# Altium footprint library PcbLib1.PcbLib: 31 footprints (part 2 of 2)
Each footprint in its own frame and in the unit in brackets; x right, y up, seen from the top. Pads: shape width x height; smd on the part's side, far side on the other; paste and mask are expansions set on the pad; w line width, h text height; cw(c..) or ccw(c..) is an arc to the next point about the centre after c.
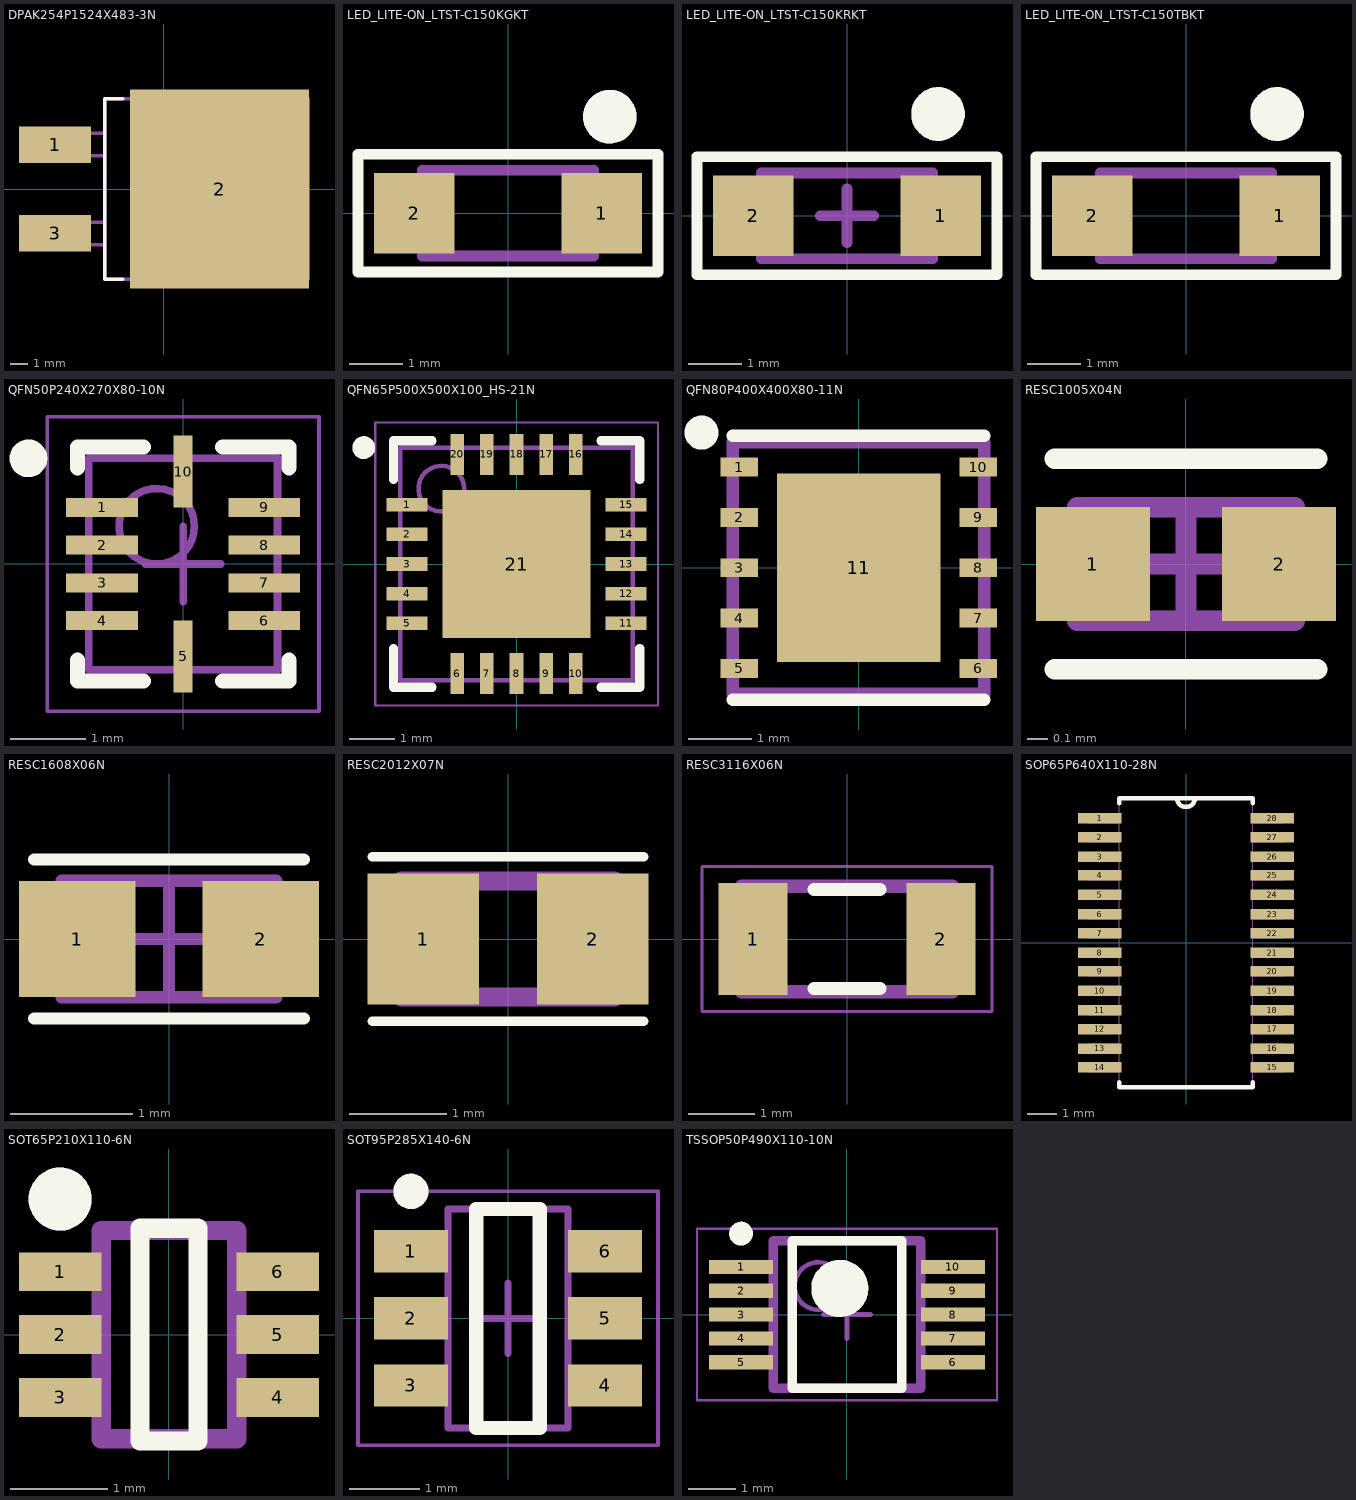
[diagram p1: the footprints below, top view; thin cyan lines are the x and y axes]

## DPAK254P1524X483-3N [mm] "D2-PAK, 3-Pads, Body 7.93x8.57mm (max), IPC Medium Density"
height 4.83
pads (3):
  rect 4.15x2.08 smd: 1(-6.25,2.54) 3(-6.25,-2.54)
  rect 10.3x11.43 smd: 2(3.2,0)
Top Overlay:
  lines w0.2: -2.35,-5.2 -3.4,-5.2 -3.4,5.2 -2.35,5.2
Mechanical 17:
  lines w0.2: -3.4,-3.2 -6.8,-3.2 -6.8,-1.9 -3.4,-1.9 ; -3.4,1.9 -6.8,1.9 -6.8,3.2 -3.4,3.2 ; -3.4,-5.2 -3.4,5.2 8.3,5.2 8.3,-5.2 -3.4,-5.2
  text ".designator" at -7.7,-0.3 h1.5
3D body "DPAK254P1524X483-3N.step": height 4.83, standoff 0, extent -6.795,-5.2 8.45,5.2

## LED_LITE-ON_LTST-C150KGKT [mm] "Lite-On Blue 1206 Chip LED"
height 1.1
pads (2):
  rect 1.5x1.5 smd: 1(1.75,0) 2(-1.75,0)
Top Overlay:
  circle w0.6: c1.9,1.8 r0.2
  lines w0.2: -2.8,-1.1 -2.8,1.1 2.8,1.1 2.8,-1.1 -2.8,-1.1
Mechanical 17:
  circle w0.6: c1.9,1.8 r0.2
  lines w0.2: -1.6,-0.8 1.6,-0.8 1.6,0.8 -1.6,0.8 -1.6,-0.8
  text ".designator" at -3.1,-2.3 h1.5
3D body "led_lite-on_ltst-c150kgkt.stp": height 1.1, standoff -0.01, extent -1.6,-0.8 1.6,0.8

## LED_LITE-ON_LTST-C150KRKT [mm] "Lite-On Blue 1206 Chip LED"
height 1.1
pads (2):
  rect 1.5x1.5 smd: 1(1.75,0) 2(-1.75,0)
Top Overlay:
  circle w0.6: c1.7,1.9 r0.2
  lines w0.2: -2.8,-1.1 -2.8,1.1 2.8,1.1 2.8,-1.1 -2.8,-1.1
Mechanical 15:
  lines w0.2: -0.5,0 0.5,0 ; 0,-0.5 0,0.5
Mechanical 17:
  circle w0.6: c1.7,1.9 r0.2
  lines w0.2: -1.6,-0.8 1.6,-0.8 1.6,0.8 -1.6,0.8 -1.6,-0.8
  text ".designator" at -3.1,-2.3 h1.5
Mechanical 29:
  circle w0.6: c1.7,1.9 r0.2
3D body "led_lite-on_ltst-c150krkt.stp": height 1.1, standoff -0.01, extent -1.6,-0.8 1.6,0.8

## LED_LITE-ON_LTST-C150TBKT [mm] "Lite-On Blue 1206 Chip LED"
height 1.1
pads (2):
  rect 1.5x1.5 smd: 1(1.75,0) 2(-1.75,0)
Top Overlay:
  circle w0.6: c1.7,1.9 r0.2
  lines w0.2: -2.8,-1.1 2.8,-1.1 2.8,1.1 -2.8,1.1 -2.8,-1.1
Mechanical 17:
  circle w0.6: c1.7,1.9 r0.2
  lines w0.2: -1.6,-0.8 1.6,-0.8 1.6,0.8 -1.6,0.8 -1.6,-0.8
  text ".designator" at -3.1,-2.3 h1.5
3D body "led_lite-on_ltst-c150tbkt.stp": height 1.1, standoff -0.01, extent -1.6,-0.8 1.6,0.8

## QFN50P240X270X80-10N [mm] "QFN, 10-Leads, Body 2.40x2.70mm, Pitch 0.50mm, IPC Medium Density"
height 0.8
pads (10):
  rect 0.95x0.25 smd: 1(-1.075,0.75) 2(-1.075,0.25) 3(-1.075,-0.25) 4(-1.075,-0.75) 6(1.075,-0.75) 7(1.075,-0.25) 8(1.075,0.25) 9(1.075,0.75)
  rect 0.25x0.95 smd: 5(0,-1.225) 10(0,1.225)
Top Overlay:
  circle w0.25: c-2.05,1.4 r0.125
  lines w0.2: -1.4,-1.275 -1.4,-1.55 -0.525,-1.55 ; -1.4,1.275 -1.4,1.55 -0.525,1.55 ; 0.525,-1.55 1.4,-1.55 1.4,-1.275 ; 0.525,1.55 1.4,1.55 1.4,1.275
Mechanical 13:
  circle w0.1: c-0.35,0.5 r0.5
  lines w0.1: -1.25,-1.4 1.25,-1.4 1.25,1.4 -1.25,1.4 -1.25,-1.4
Mechanical 15:
  lines w0.05: -1.8,-1.95 1.8,-1.95 1.8,1.95 -1.8,1.95 -1.8,-1.95
  lines w0.1: -0.5,0 0.5,0 ; 0,-0.5 0,0.5
3D body "QFN50P240X270X80-10N.step": height 0.8, standoff 0, extent -1.251,-1.401 1.251,1.401

## QFN65P500X500X100_HS-21N [mm] "QFN, 20-Leads, Body 5.00x5.00mm, Pitch 0.65mm, Thermal Pad 3.25x3.25mm, IPC Medium Density"
height 1
pads (21):
  rect 0.9x0.3 smd: 1(-2.4,1.3) 2(-2.4,0.65) 3(-2.4,0) 4(-2.4,-0.65) 5(-2.4,-1.3) 11(2.4,-1.3) 12(2.4,-0.65) 13(2.4,0) 14(2.4,0.65) 15(2.4,1.3)
  rect 0.3x0.9 smd: 6(-1.3,-2.4) 7(-0.65,-2.4) 8(0,-2.4) 9(0.65,-2.4) 10(1.3,-2.4) 16(1.3,2.4) 17(0.65,2.4) 18(0,2.4) 19(-0.65,2.4) 20(-1.3,2.4)
  rect 3.25x3.25 smd: 21(0,0)
Top Overlay:
  circle w0.25: c-3.35,2.55 r0.125
  lines w0.2: -2.7,-1.85 -2.7,-2.7 -1.85,-2.7 ; -2.7,1.85 -2.7,2.7 -1.85,2.7 ; 1.85,-2.7 2.7,-2.7 2.7,-1.85 ; 1.85,2.7 2.7,2.7 2.7,1.85
Mechanical 13:
  circle w0.1: c-1.65,1.65 r0.5
  lines w0.1: -2.55,-2.55 -2.55,2.55 2.55,2.55 2.55,-2.55 -2.55,-2.55
Mechanical 15:
  lines w0.05: -3.1,-3.1 -3.1,3.1 3.1,3.1 3.1,-3.1 -3.1,-3.1
  lines w0.1: -0.5,0 0.5,0 ; 0,-0.5 0,0.5
3D body "QFN65P500X500X100_HS-21N.step": height 1, standoff 0, extent -2.551,-2.551 2.551,2.551

## QFN80P400X400X80-11N [mm] "QFN, 10-Leads, Body 4.0x4.00mm, Pitch 0.80mm, Thermal Pad 3.00x2.60mm, IPC Medium Density"
height 0.8
pads (11):
  rect 0.6x0.3 smd mask+0.07: 1(-1.9,1.6) 2(-1.9,0.8) 3(-1.9,0) 4(-1.9,-0.8) 5(-1.9,-1.6) 6(1.9,-1.6) 7(1.9,-0.8) 8(1.9,0) 9(1.9,0.8) 10(1.9,1.6)
  rect 2.6x3 smd mask+0.07: 11(0,0)
Top Overlay:
  circle w0.4: c-2.5,2.15 r0.071
  lines w0.2: -2,-2.1 2,-2.1 ; -2,2.1 2,2.1
Mechanical 17:
  circle w0.4: c-2.5,2.15 r0.05
  lines w0.2: -2,-2 -2,2 2,2 2,-2 -2,-2
  text ".designator" at -2,2.45 h1.5
3D body "QFN80P400X400X80-11N.STEP": height 0.8, standoff 0, extent -2,-2 2,2

## RESC1005X04N [mm] "Chip Resistor, 2-Leads, Body 1.00x0.50mm, IPC Medium Density"
height 0.4
pads (2):
  rect 0.55x0.55 smd: 1(-0.45,0) 2(0.45,0)
Top Overlay:
  lines w0.1: -0.635,-0.508 0.635,-0.508 ; -0.635,0.508 0.635,0.508
Mechanical 15:
  lines w0.1: -0.275,0 0.275,0 ; 0,-0.275 0,0.275
Mechanical 17:
  lines w0.1: -0.525,-0.275 -0.525,0.275 0.525,0.275 0.525,-0.275 -0.525,-0.275
  text ".designator" at -0.95,0.65 h1.5
3D body "RESC1005X04N.step": height 0.4, standoff 0, extent -0.525,-0.275 0.525,0.275

## RESC1608X06N [mm] "Chip Resistor, 2-Leads, Body 1.60x0.85mm, IPC Medium Density"
height 0.55
pads (2):
  rect 0.95x0.95 smd: 1(-0.75,0) 2(0.75,0)
Top Overlay:
  lines w0.1: -1.1,-0.65 1.1,-0.65 ; -1.1,0.65 1.1,0.65
Mechanical 15:
  lines w0.1: -0.475,0 0.475,0 ; 0,-0.475 0,0.475
Mechanical 17:
  lines w0.1: -0.875,-0.475 -0.875,0.475 0.875,0.475 0.875,-0.475 -0.875,-0.475
  text ".designator" at -1.25,0.95 h1.5
3D body "RESC1608X06N.step": height 0.55, standoff 0, extent -0.875,-0.475 0.875,0.475

## RESC2012X07N [mm] "Chip Resistor, 2-Leads, Body 2.00x1.25mm, IPC Medium Density"
height 0.7
pads (2):
  rect 1.15x1.35 smd: 1(-0.875,0) 2(0.875,0)
Top Overlay:
  lines w0.1: -1.4,-0.85 1.4,-0.85 ; -1.4,0.85 1.4,0.85
Mechanical 17:
  lines w0.2: -1.1,-0.6 -1.1,0.6 1.1,0.6 1.1,-0.6 -1.1,-0.6
  text ".designator" at -1.6,1.4 h1.5
3D body "RESC2012X07N.step": height 0.7, standoff 0, extent -1.1,-0.675 1.1,0.675

## RESC3116X06N [mm] "Chip Resistor, 2-Leads, Body 3.10x1.60mm, IPC Medium Density"
height 0.65
pads (2):
  rect 1.05x1.7 smd: 1(-1.425,0) 2(1.425,0)
Top Overlay:
  lines w0.2: -0.5,-0.75 0.5,-0.75 ; -0.5,0.75 0.5,0.75
Mechanical 15:
  lines w0.05: -2.2,-1.1 2.2,-1.1 2.2,1.1 -2.2,1.1 -2.2,-1.1
Mechanical 17:
  lines w0.2: -1.6,-0.8 1.6,-0.8 1.6,0.8 -1.6,0.8 -1.6,-0.8
  text ".designator" at -2.2,1.5 h1.5
3D body "RESC3116X06N.step": height 0.65, standoff 0, extent -1.6,-0.85 1.6,0.85

## SOP65P640X110-28N [mil]
pads (28):
  rect 58x14 smd: 1(-115,166) 2(-115,141) 3(-115,115) 4(-115,90) 5(-115,64) 6(-115,38) 7(-115,13) 8(-115,-13) 9(-115,-38) 10(-115,-64) 11(-115,-90) 12(-115,-115) 13(-115,-141) 14(-115,-166) 15(115,-166) 16(115,-141) 17(115,-115) 18(115,-90) 19(115,-64) 20(115,-38) 21(115,-13) 22(115,13) 23(115,38) 24(115,64) 25(115,90) 26(115,115) 27(115,141) 28(115,166)
Top Overlay:
  lines w6: -89,-186 -89,-193 89,-193 89,-186 ; -89,186 -89,193 -12,193 ; 89,186 89,193 12,193 ; -12,193 ccw(c0,193) 12,193 ; -12,193 12,193
Mechanical 13:
  lines w0: -12,193 ccw(c0,193) 12,193 ; -12,193 -89,193 -89,-193 89,-193 89,193 12,193 ; -12,193 12,193 ; -130,-172 -89,-172 -89,-160 -130,-160 -130,-172 ; -130,-147 -89,-147 -89,-135 -130,-135 -130,-147 ; -130,-121 -89,-121 -89,-109 -130,-109 -130,-121 ; -130,-96 -89,-96 -89,-84 -130,-84 -130,-96 ; -130,-70 -89,-70 -89,-58 -130,-58 -130,-70 ; -130,-44 -89,-44 -89,-32 -130,-32 -130,-44 ; -130,-19 -89,-19 -89,-7 -130,-7 -130,-19 ; -130,7 -89,7 -89,19 -130,19 -130,7 ; -130,32 -89,32 -89,44 -130,44 -130,32 ; -130,58 -89,58 -89,70 -130,70 -130,58 ; -130,84 -89,84 -89,96 -130,96 -130,84 ; -130,109 -89,109 -89,121 -130,121 -130,109 ; -130,135 -89,135 -89,147 -130,147 -130,135 ; -130,160 -89,160 -89,172 -130,172 -130,160 ; 89,-172 130,-172 130,-160 89,-160 89,-172 ; 89,-147 130,-147 130,-135 89,-135 89,-147 ; 89,-121 130,-121 130,-109 89,-109 89,-121 ; 89,-96 130,-96 130,-84 89,-84 89,-96 ; 89,-70 130,-70 130,-58 89,-58 89,-70 ; 89,-44 130,-44 130,-32 89,-32 89,-44 ; 89,-19 130,-19 130,-7 89,-7 89,-19 ; 89,7 130,7 130,19 89,19 89,7 ; 89,32 130,32 130,44 89,44 89,32 ; 89,58 130,58 130,70 89,70 89,58 ; 89,84 130,84 130,96 89,96 89,84 ; 89,109 130,109 130,121 89,121 89,109 ; 89,135 130,135 130,147 89,147 89,135 ; 89,160 130,160 130,172 89,172 89,160
3D body "step_temp.STEP": height 43.31, standoff 0, extent -125.98,-190.94 125.98,190.94

## SOT65P210X110-6N [mm] "SOT23, 6-Leads, Body 2.00x2.10mm, Pitch 0.65mm, IPC Medium Density"
height 1.1
pads (6):
  rect 0.85x0.4 smd: 1(-1.125,0.65) 2(-1.125,0) 3(-1.125,-0.65) 4(1.125,-0.65) 5(1.125,0) 6(1.125,0.65)
Top Overlay:
  circle w0.4: c-1.125,1.4 r0.125
  lines w0.2: -0.3,-1.1 0.3,-1.1 0.3,1.1 -0.3,1.1 -0.3,-1.1
Mechanical 17:
  circle w0.4: c-1.125,1.4 r0.125
  lines w0.2: -0.7,-1.075 0.7,-1.075 0.7,1.075 -0.7,1.075 -0.7,-1.075
  text ".designator" at -0.3,1.45 h1.5
3D body "SOT65P220X110-6N.stp": height 1.1, standoff 0, extent -1.05,-1 1.05,1

## SOT95P285X140-6N [mm] "SOT23, 6-Leads, Body 3.00x2.85mm, Pitch 0.95mm, IPC Medium Density"
height 1.4
pads (6):
  rect 1.05x0.6 smd: 1(-1.375,0.95) 2(-1.375,0) 3(-1.375,-0.95) 4(1.375,-0.95) 5(1.375,0) 6(1.375,0.95)
Top Overlay:
  circle w0.25: c-1.375,1.8 r0.125
  lines w0.2: -0.45,-1.55 0.45,-1.55 0.45,1.55 -0.45,1.55 -0.45,-1.55
Mechanical 13:
  lines w0.1: -0.85,-1.55 -0.85,1.55 0.85,1.55 0.85,-1.55 -0.85,-1.55
Mechanical 15:
  lines w0.05: -2.125,-1.8 -2.125,1.8 2.125,1.8 2.125,-1.8 -2.125,-1.8
  lines w0.1: -0.5,0 0.5,0 ; 0,-0.5 0,0.5
3D body "SOT95P285X140-6N.step": height 1.4, standoff 0, extent -1.5,-1.55 1.5,1.55

## TSSOP50P490X110-10N [mm] "TSSOP, 10-Leads, Body 3.00x3.00mm, Pitch 0.50mm, IPC Medium Density"
height 1.1
pads (10):
  rect 1.35x0.3 smd: 1(-2.225,1) 2(-2.225,0.5) 3(-2.225,0) 4(-2.225,-0.5) 5(-2.225,-1) 6(2.225,-1) 7(2.225,-0.5) 8(2.225,0) 9(2.225,0.5) 10(2.225,1)
Top Overlay:
  circle w0.6: c-0.15,0.55 r0.3
  circle w0.25: c-2.225,1.7 r0.125
  lines w0.2: -1.15,-1.55 1.15,-1.55 1.15,1.55 -1.15,1.55 -1.15,-1.55
Mechanical 13:
  circle w0.1: c-0.6,0.6 r0.5
  lines w0.2: -1.55,-1.55 1.55,-1.55 1.55,1.55 -1.55,1.55 -1.55,-1.55
Mechanical 15:
  lines w0.05: -3.15,-1.8 3.15,-1.8 3.15,1.8 -3.15,1.8 -3.15,-1.8
  lines w0.1: -0.5,0 0.5,0 ; 0,-0.5 0,0.5
3D body "TSSOP50P490X110-10N.step": height 1.1, standoff 0, extent -2.45,-1.55 2.45,1.55